# Altium footprint library TUNA_AL-CAP_Lib.PcbLib: 133 footprints (part 8 of 9)
Each footprint in its own frame and in the unit in brackets; x right, y up, seen from the top. Pads: shape width x height; smd on the part's side, far side on the other; paste and mask are expansions set on the pad; w line width, h text height; cw(c..) or ccw(c..) is an arc to the next point about the centre after c.
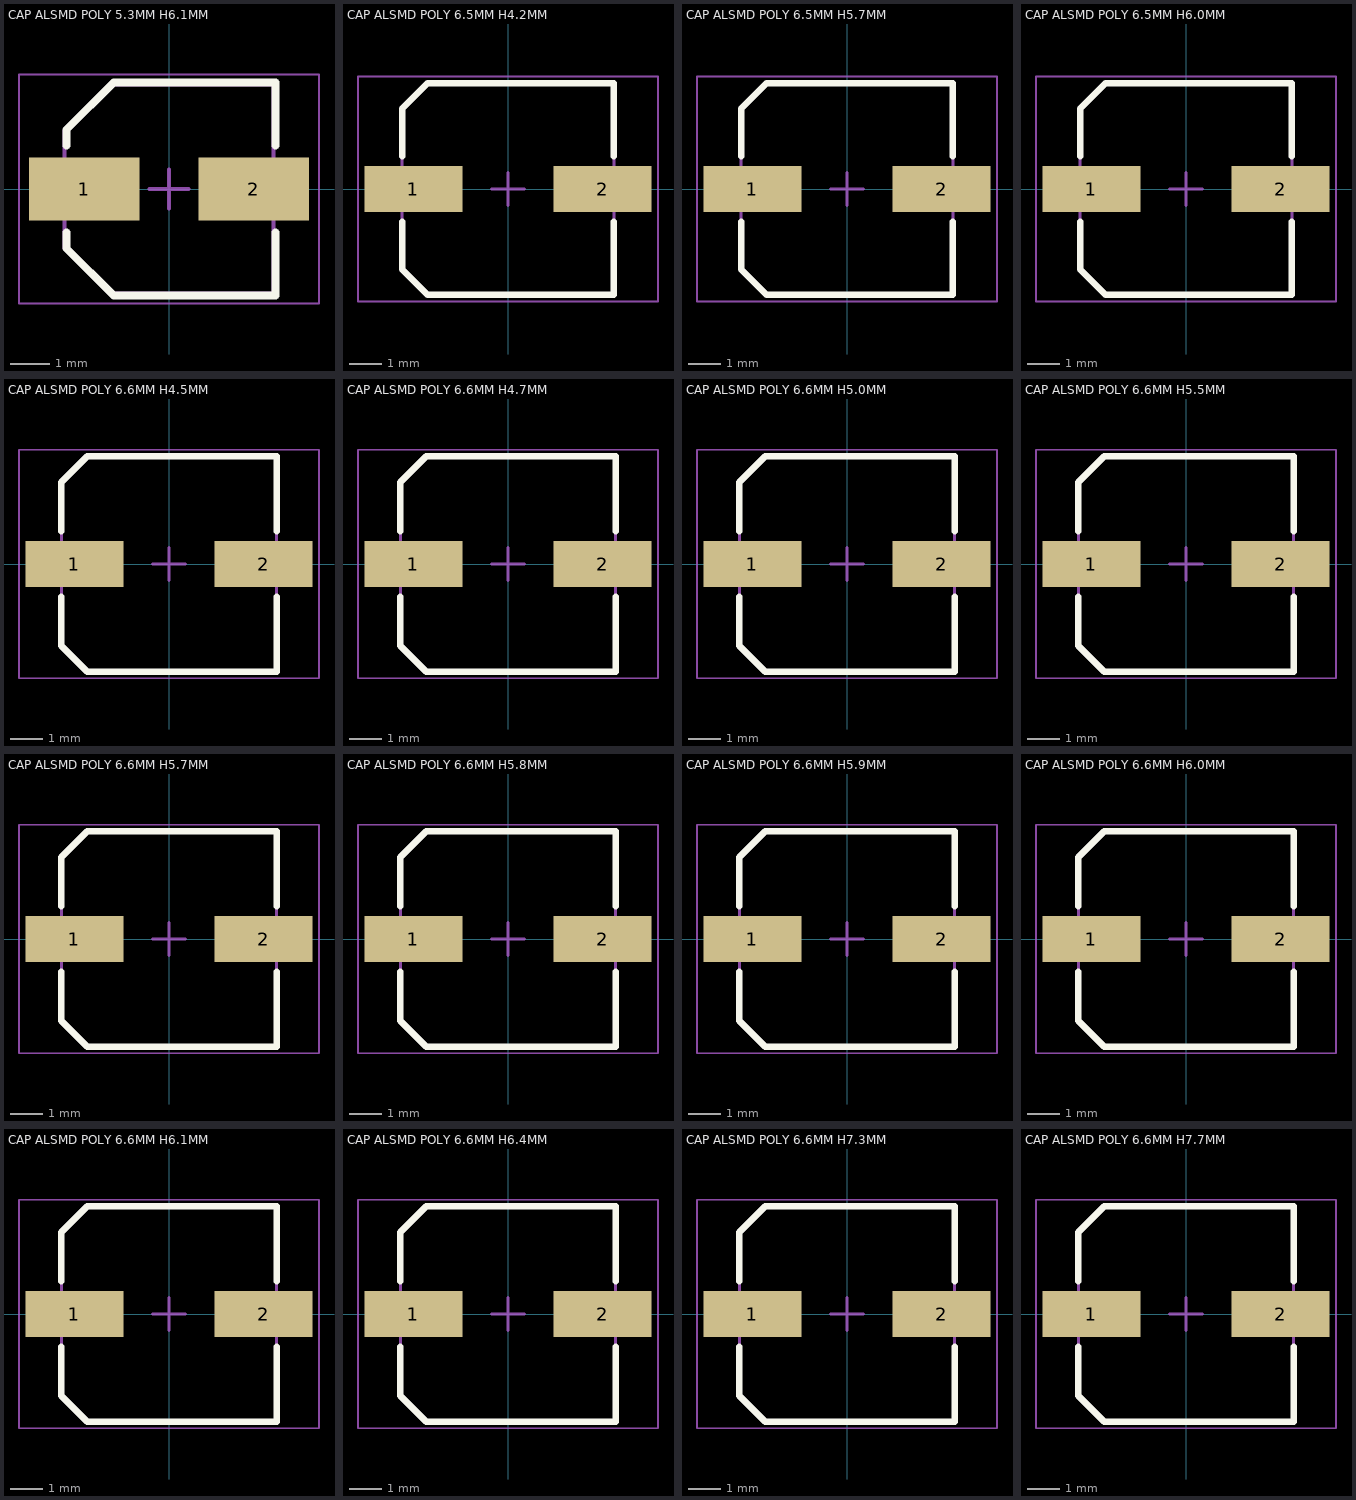
[diagram p7: the footprints below, top view; thin cyan lines are the x and y axes]

## CAP ALSMD POLY 5.3MM H6.1MM [mm] "Aluminum Polymer Capacitor, Body 5.30x5.30x6.1mm, IPC Medium Density"
height 6.1
pads (2):
  rect 2.8x1.6 smd: 1(-2.15,0) 2(2.15,0)
Top Overlay:
  lines w0.2: -2.6,-1.1 -2.6,-1.5 -1.4,-2.7 2.7,-2.7 2.7,-1.1 ; -2.6,1.1 -2.6,1.5 -1.4,2.7 2.7,2.7 2.7,1.1
Mechanical 13:
  lines w0.1: -2.65,-1.5 -2.65,1.475 -1.475,2.65 2.65,2.65 2.65,-2.65 -1.5,-2.65 -2.65,-1.5
Mechanical 15:
  lines w0.05: -3.8,-2.9 -3.8,2.9 3.8,2.9 3.8,-2.9 -3.8,-2.9
  lines w0.1: -0.5,0 0.5,0 ; 0,-0.5 0,0.5
3D body "CAP ALSMD - POLY - 5.3 x 5.3 x 6.1.step": height 6.1, standoff 0, extent -2.95,-2.7 2.95,2.7

## CAP ALSMD POLY 6.5MM H4.2MM [mm] "Aluminum SMT Polymer Capacitor, 6.3mm Diameter, 4.20mm Height, 7.20mm Maximum Leads Span"
height 0.7
pads (2):
  rect 3x1.4 smd: 1(-2.9,0) 2(2.9,0)
Top Overlay:
  lines w0.2: -3.25,-1 -3.25,-2.462 -2.462,-3.25 3.25,-3.25 3.25,-1 ; -3.25,1 -3.25,2.462 -2.462,3.25 3.25,3.25 3.25,1
Mechanical 13:
  lines w0.1: -3.25,-2.462 -3.25,2.462 -2.462,3.25 3.25,3.25 3.25,-3.25 -2.462,-3.25 -3.25,-2.462
Mechanical 15:
  lines w0.05: -4.6,-3.45 -4.6,3.45 4.6,3.45 4.6,-3.45 -4.6,-3.45
  lines w0.1: -0.5,0 0.5,0 ; 0,-0.5 0,0.5
3D body ".STEP": height 4.2, standoff 0, extent -3.6,-3.25 3.6,3.25

## CAP ALSMD POLY 6.5MM H5.7MM [mm] "Aluminum SMT Polymer Capacitor, 6.3mm Diameter, 5.70mm Height, 7.20mm Maximum Leads Span"
height 0.7
pads (2):
  rect 3x1.4 smd: 1(-2.9,0) 2(2.9,0)
Top Overlay:
  lines w0.2: -3.25,-1 -3.25,-2.462 -2.462,-3.25 3.25,-3.25 3.25,-1 ; -3.25,1 -3.25,2.462 -2.462,3.25 3.25,3.25 3.25,1
Mechanical 13:
  lines w0.1: -3.25,-2.462 -2.462,-3.25 3.25,-3.25 3.25,3.25 -2.462,3.25 -3.25,2.462 -3.25,-2.462
Mechanical 15:
  lines w0.05: -4.6,-3.45 4.6,-3.45 4.6,3.45 -4.6,3.45 -4.6,-3.45
  lines w0.1: -0.5,0 0.5,0 ; 0,-0.5 0,0.5
3D body ".STEP": height 5.7, standoff 0, extent -3.6,-3.25 3.6,3.25

## CAP ALSMD POLY 6.5MM H6.0MM [mm] "Aluminum SMT Polymer Capacitor, 6.3mm Diameter, 6.00mm Height, 7.20mm Maximum Leads Span"
height 0.7
pads (2):
  rect 3x1.4 smd: 1(-2.9,0) 2(2.9,0)
Top Overlay:
  lines w0.2: -3.25,-1 -3.25,-2.462 -2.462,-3.25 3.25,-3.25 3.25,-1 ; -3.25,1 -3.25,2.462 -2.462,3.25 3.25,3.25 3.25,1
Mechanical 13:
  lines w0.1: -3.25,-2.462 -2.462,-3.25 3.25,-3.25 3.25,3.25 -2.462,3.25 -3.25,2.462 -3.25,-2.462
Mechanical 15:
  lines w0.05: -4.6,-3.45 4.6,-3.45 4.6,3.45 -4.6,3.45 -4.6,-3.45
  lines w0.1: -0.5,0 0.5,0 ; 0,-0.5 0,0.5
3D body ".STEP": height 6, standoff 0, extent -3.6,-3.25 3.6,3.25

## CAP ALSMD POLY 6.6MM H4.5MM [mm] "Aluminum SMT Polymer Capacitor, 6.3mm Diameter, 4.50mm Height, 7.20mm Maximum Leads Span"
height 0.7
pads (2):
  rect 3x1.4 smd: 1(-2.9,0) 2(2.9,0)
Top Overlay:
  lines w0.2: -3.3,-1 -3.3,-2.512 -2.512,-3.3 3.3,-3.3 3.3,-1 ; -3.3,1 -3.3,2.512 -2.512,3.3 3.3,3.3 3.3,1
Mechanical 13:
  lines w0.1: -3.3,-2.512 -3.3,2.512 -2.512,3.3 3.3,3.3 3.3,-3.3 -2.512,-3.3 -3.3,-2.512
Mechanical 15:
  lines w0.05: -4.6,-3.5 -4.6,3.5 4.6,3.5 4.6,-3.5 -4.6,-3.5
  lines w0.1: -0.5,0 0.5,0 ; 0,-0.5 0,0.5
3D body ".STEP": height 4.5, standoff 0, extent -3.6,-3.3 3.6,3.3

## CAP ALSMD POLY 6.6MM H4.7MM [mm] "Aluminum SMT Polymer Capacitor, 6.3mm Diameter, 4.70mm Height, 7.20mm Maximum Leads Span"
height 0.7
pads (2):
  rect 3x1.4 smd: 1(-2.9,0) 2(2.9,0)
Top Overlay:
  lines w0.2: -3.3,-1 -3.3,-2.512 -2.512,-3.3 3.3,-3.3 3.3,-1 ; -3.3,1 -3.3,2.512 -2.512,3.3 3.3,3.3 3.3,1
Mechanical 13:
  lines w0.1: -3.3,-2.512 -3.3,2.512 -2.512,3.3 3.3,3.3 3.3,-3.3 -2.512,-3.3 -3.3,-2.512
Mechanical 15:
  lines w0.05: -4.6,-3.5 -4.6,3.5 4.6,3.5 4.6,-3.5 -4.6,-3.5
  lines w0.1: -0.5,0 0.5,0 ; 0,-0.5 0,0.5
3D body ".STEP": height 4.7, standoff 0, extent -3.6,-3.3 3.6,3.3

## CAP ALSMD POLY 6.6MM H5.0MM [mm] "Aluminum SMT Polymer Capacitor, 6.3mm Diameter, 5.00mm Height, 7.20mm Maximum Leads Span"
height 0.7
pads (2):
  rect 3x1.4 smd: 1(-2.9,0) 2(2.9,0)
Top Overlay:
  lines w0.2: -3.3,-1 -3.3,-2.512 -2.512,-3.3 3.3,-3.3 3.3,-1 ; -3.3,1 -3.3,2.512 -2.512,3.3 3.3,3.3 3.3,1
Mechanical 13:
  lines w0.1: -3.3,-2.512 -2.512,-3.3 3.3,-3.3 3.3,3.3 -2.512,3.3 -3.3,2.512 -3.3,-2.512
Mechanical 15:
  lines w0.05: -4.6,-3.5 4.6,-3.5 4.6,3.5 -4.6,3.5 -4.6,-3.5
  lines w0.1: -0.5,0 0.5,0 ; 0,-0.5 0,0.5
3D body ".STEP": height 5, standoff 0, extent -3.6,-3.3 3.6,3.3

## CAP ALSMD POLY 6.6MM H5.5MM [mm] "Aluminum SMT Polymer Capacitor, 6.3mm Diameter, 5.50mm Height, 7.20mm Maximum Leads Span"
height 0.7
pads (2):
  rect 3x1.4 smd: 1(-2.9,0) 2(2.9,0)
Top Overlay:
  lines w0.2: -3.3,-1 -3.3,-2.512 -2.512,-3.3 3.3,-3.3 3.3,-1 ; -3.3,1 -3.3,2.512 -2.512,3.3 3.3,3.3 3.3,1
Mechanical 13:
  lines w0.1: -3.3,-2.512 -2.512,-3.3 3.3,-3.3 3.3,3.3 -2.512,3.3 -3.3,2.512 -3.3,-2.512
Mechanical 15:
  lines w0.05: -4.6,-3.5 4.6,-3.5 4.6,3.5 -4.6,3.5 -4.6,-3.5
  lines w0.1: -0.5,0 0.5,0 ; 0,-0.5 0,0.5
3D body ".STEP": height 5.5, standoff 0, extent -3.6,-3.3 3.6,3.3

## CAP ALSMD POLY 6.6MM H5.7MM [mm] "Aluminum SMT Polymer Capacitor, 6.3mm Diameter, 5.70mm Height, 7.20mm Maximum Leads Span"
height 0.7
pads (2):
  rect 3x1.4 smd: 1(-2.9,0) 2(2.9,0)
Top Overlay:
  lines w0.2: -3.3,-1 -3.3,-2.512 -2.512,-3.3 3.3,-3.3 3.3,-1 ; -3.3,1 -3.3,2.512 -2.512,3.3 3.3,3.3 3.3,1
Mechanical 13:
  lines w0.1: -3.3,-2.512 -2.512,-3.3 3.3,-3.3 3.3,3.3 -2.512,3.3 -3.3,2.512 -3.3,-2.512
Mechanical 15:
  lines w0.05: -4.6,-3.5 4.6,-3.5 4.6,3.5 -4.6,3.5 -4.6,-3.5
  lines w0.1: -0.5,0 0.5,0 ; 0,-0.5 0,0.5
3D body ".STEP": height 5.7, standoff 0, extent -3.6,-3.3 3.6,3.3

## CAP ALSMD POLY 6.6MM H5.8MM [mm] "Aluminum SMT Polymer Capacitor, 6.3mm Diameter, 5.80mm Height, 7.20mm Maximum Leads Span"
height 0.7
pads (2):
  rect 3x1.4 smd: 1(-2.9,0) 2(2.9,0)
Top Overlay:
  lines w0.2: -3.3,-1 -3.3,-2.512 -2.512,-3.3 3.3,-3.3 3.3,-1 ; -3.3,1 -3.3,2.512 -2.512,3.3 3.3,3.3 3.3,1
Mechanical 13:
  lines w0.1: -3.3,-2.512 -2.512,-3.3 3.3,-3.3 3.3,3.3 -2.512,3.3 -3.3,2.512 -3.3,-2.512
Mechanical 15:
  lines w0.05: -4.6,-3.5 4.6,-3.5 4.6,3.5 -4.6,3.5 -4.6,-3.5
  lines w0.1: -0.5,0 0.5,0 ; 0,-0.5 0,0.5
3D body ".STEP": height 5.8, standoff 0, extent -3.6,-3.3 3.6,3.3

## CAP ALSMD POLY 6.6MM H5.9MM [mm] "Aluminum SMT Polymer Capacitor, 6.3mm Diameter, 5.90mm Height, 7.20mm Maximum Leads Span"
height 0.7
pads (2):
  rect 3x1.4 smd: 1(-2.9,0) 2(2.9,0)
Top Overlay:
  lines w0.2: -3.3,-1 -3.3,-2.512 -2.512,-3.3 3.3,-3.3 3.3,-1 ; -3.3,1 -3.3,2.512 -2.512,3.3 3.3,3.3 3.3,1
Mechanical 13:
  lines w0.1: -3.3,-2.512 -2.512,-3.3 3.3,-3.3 3.3,3.3 -2.512,3.3 -3.3,2.512 -3.3,-2.512
Mechanical 15:
  lines w0.05: -4.6,-3.5 4.6,-3.5 4.6,3.5 -4.6,3.5 -4.6,-3.5
  lines w0.1: -0.5,0 0.5,0 ; 0,-0.5 0,0.5
3D body ".STEP": height 5.9, standoff 0, extent -3.6,-3.3 3.6,3.3

## CAP ALSMD POLY 6.6MM H6.0MM [mm] "Aluminum SMT Polymer Capacitor, 6.3mm Diameter, 6.00mm Height, 7.20mm Maximum Leads Span"
height 0.7
pads (2):
  rect 3x1.4 smd: 1(-2.9,0) 2(2.9,0)
Top Overlay:
  lines w0.2: -3.3,-1 -3.3,-2.512 -2.512,-3.3 3.3,-3.3 3.3,-1 ; -3.3,1 -3.3,2.512 -2.512,3.3 3.3,3.3 3.3,1
Mechanical 13:
  lines w0.1: -3.3,-2.512 -3.3,2.512 -2.512,3.3 3.3,3.3 3.3,-3.3 -2.512,-3.3 -3.3,-2.512
Mechanical 15:
  lines w0.05: -4.6,-3.5 -4.6,3.5 4.6,3.5 4.6,-3.5 -4.6,-3.5
  lines w0.1: -0.5,0 0.5,0 ; 0,-0.5 0,0.5
3D body ".STEP": height 6, standoff 0, extent -3.6,-3.3 3.6,3.3

## CAP ALSMD POLY 6.6MM H6.1MM [mm] "Aluminum SMT Polymer Capacitor, 6.3mm Diameter, 6.10mm Height, 7.20mm Maximum Leads Span"
height 0.7
pads (2):
  rect 3x1.4 smd: 1(-2.9,0) 2(2.9,0)
Top Overlay:
  lines w0.2: -3.3,-1 -3.3,-2.512 -2.512,-3.3 3.3,-3.3 3.3,-1 ; -3.3,1 -3.3,2.512 -2.512,3.3 3.3,3.3 3.3,1
Mechanical 13:
  lines w0.1: -3.3,-2.512 -2.512,-3.3 3.3,-3.3 3.3,3.3 -2.512,3.3 -3.3,2.512 -3.3,-2.512
Mechanical 15:
  lines w0.05: -4.6,-3.5 4.6,-3.5 4.6,3.5 -4.6,3.5 -4.6,-3.5
  lines w0.1: -0.5,0 0.5,0 ; 0,-0.5 0,0.5
3D body ".STEP": height 6.1, standoff 0, extent -3.6,-3.3 3.6,3.3

## CAP ALSMD POLY 6.6MM H6.4MM [mm] "Aluminum SMT Polymer Capacitor, 6.3mm Diameter, 6.40mm Height, 7.20mm Maximum Leads Span"
height 0.7
pads (2):
  rect 3x1.4 smd: 1(-2.9,0) 2(2.9,0)
Top Overlay:
  lines w0.2: -3.3,-1 -3.3,-2.512 -2.512,-3.3 3.3,-3.3 3.3,-1 ; -3.3,1 -3.3,2.512 -2.512,3.3 3.3,3.3 3.3,1
Mechanical 13:
  lines w0.1: -3.3,-2.512 -2.512,-3.3 3.3,-3.3 3.3,3.3 -2.512,3.3 -3.3,2.512 -3.3,-2.512
Mechanical 15:
  lines w0.05: -4.6,-3.5 4.6,-3.5 4.6,3.5 -4.6,3.5 -4.6,-3.5
  lines w0.1: -0.5,0 0.5,0 ; 0,-0.5 0,0.5
3D body ".STEP": height 6.4, standoff 0, extent -3.6,-3.3 3.6,3.3

## CAP ALSMD POLY 6.6MM H7.3MM [mm] "Aluminum SMT Polymer Capacitor, 6.3mm Diameter, 7.30mm Height, 7.20mm Maximum Leads Span"
height 0.7
pads (2):
  rect 3x1.4 smd: 1(-2.9,0) 2(2.9,0)
Top Overlay:
  lines w0.2: -3.3,-1 -3.3,-2.512 -2.512,-3.3 3.3,-3.3 3.3,-1 ; -3.3,1 -3.3,2.512 -2.512,3.3 3.3,3.3 3.3,1
Mechanical 13:
  lines w0.1: -3.3,-2.512 -2.512,-3.3 3.3,-3.3 3.3,3.3 -2.512,3.3 -3.3,2.512 -3.3,-2.512
Mechanical 15:
  lines w0.05: -4.6,-3.5 4.6,-3.5 4.6,3.5 -4.6,3.5 -4.6,-3.5
  lines w0.1: -0.5,0 0.5,0 ; 0,-0.5 0,0.5
3D body ".STEP": height 7.3, standoff 0, extent -3.6,-3.3 3.6,3.3

## CAP ALSMD POLY 6.6MM H7.7MM [mm] "Aluminum SMT Polymer Capacitor, 6.3mm Diameter, 7.70mm Height, 7.20mm Maximum Leads Span"
height 0.7
pads (2):
  rect 3x1.4 smd: 1(-2.9,0) 2(2.9,0)
Top Overlay:
  lines w0.2: -3.3,-1 -3.3,-2.512 -2.512,-3.3 3.3,-3.3 3.3,-1 ; -3.3,1 -3.3,2.512 -2.512,3.3 3.3,3.3 3.3,1
Mechanical 13:
  lines w0.1: -3.3,-2.512 -3.3,2.512 -2.512,3.3 3.3,3.3 3.3,-3.3 -2.512,-3.3 -3.3,-2.512
Mechanical 15:
  lines w0.05: -4.6,-3.5 -4.6,3.5 4.6,3.5 4.6,-3.5 -4.6,-3.5
  lines w0.1: -0.5,0 0.5,0 ; 0,-0.5 0,0.5
3D body ".STEP": height 7.7, standoff 0, extent -3.6,-3.3 3.6,3.3